# Altium footprint library PCB_Display_Doru.PcbLib: 47 footprints (part 3 of 3)
Each footprint in its own frame and in the unit in brackets; x right, y up, seen from the top. Pads: shape width x height; smd on the part's side, far side on the other; paste and mask are expansions set on the pad; w line width, h text height; cw(c..) or ccw(c..) is an arc to the next point about the centre after c.
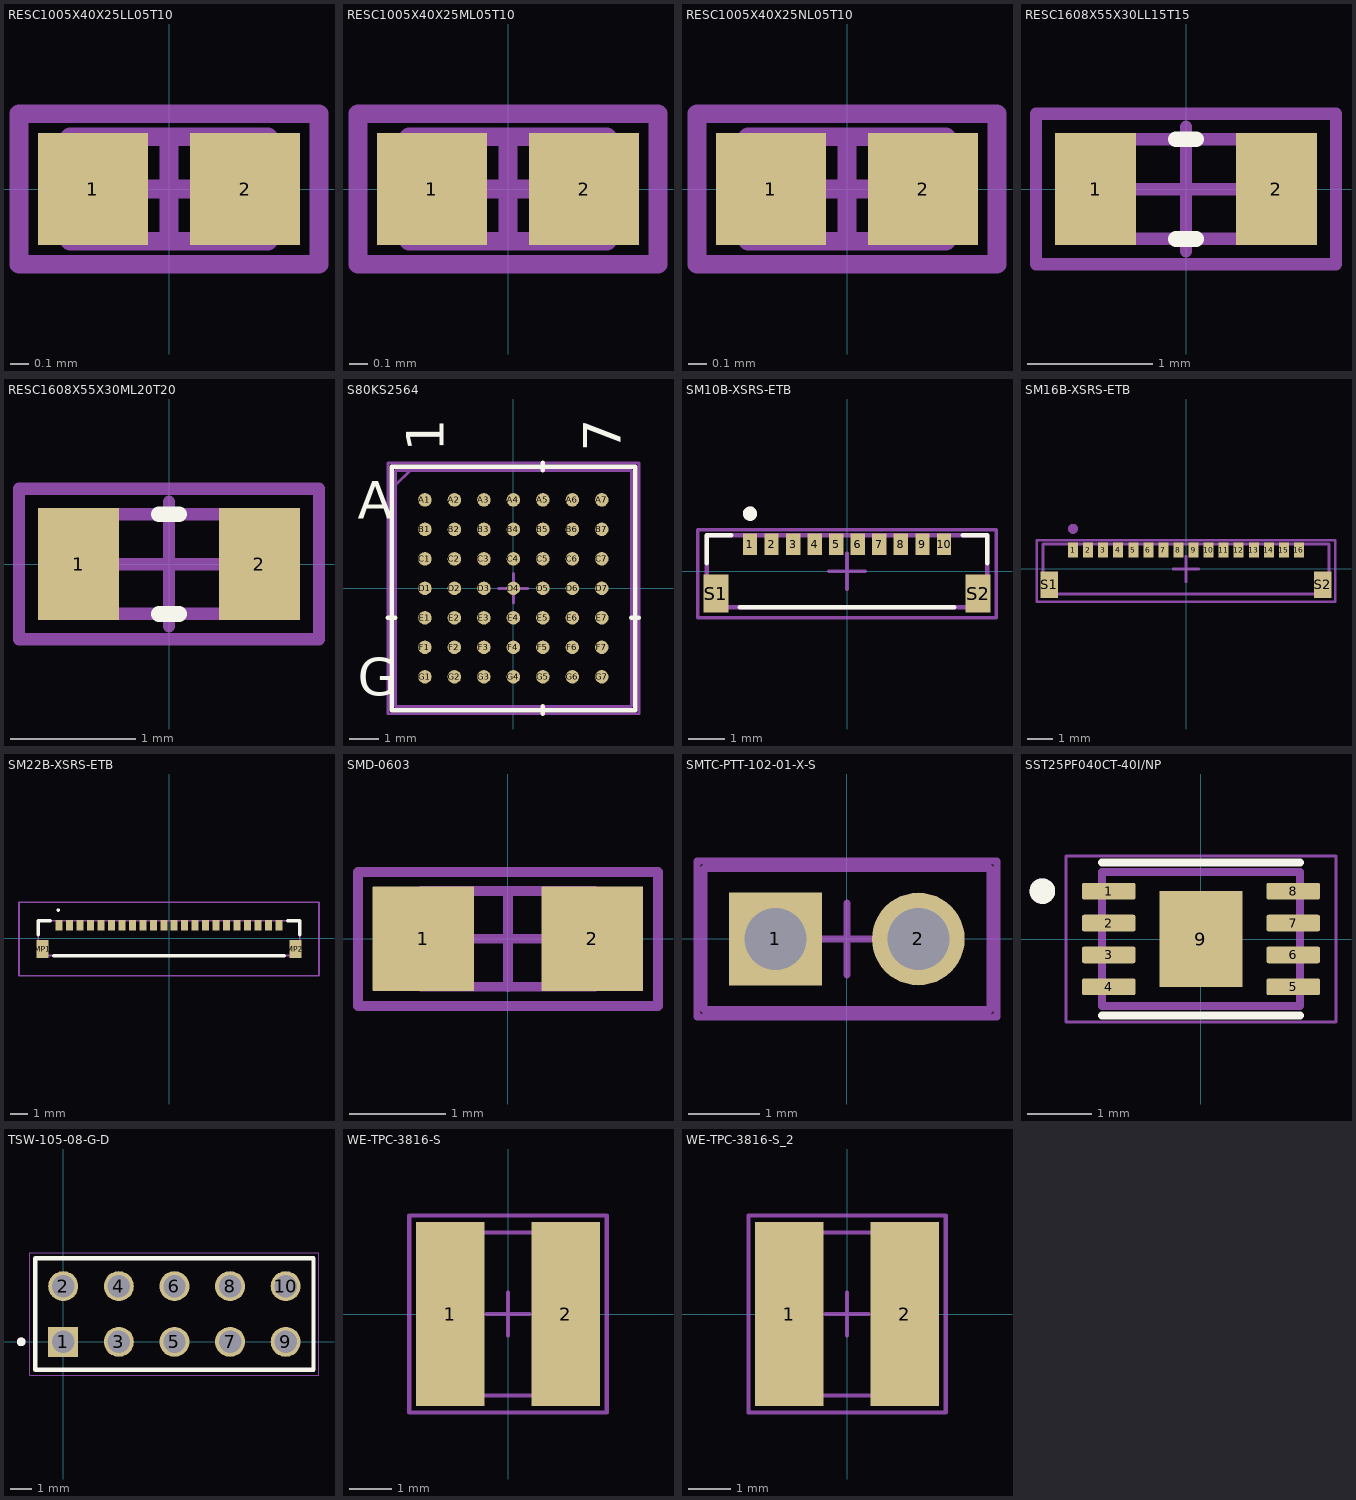
[diagram p2: the footprints below, top view; thin cyan lines are the x and y axes]

## RESC1005X40X25LL05T10 [mm] "Chip Resistor, 2-Leads, Body 1.00x0.50mm, IPC High Density"
height 0.4
pads (2):
  rrect1% 0.59x0.6 smd mask+0.05: 1(-0.407,0) 2(0.407,0)
Top Assembly (Mech13):
  lines w0.1: -0.53,-0.28 -0.53,0.28 0.53,0.28 0.53,-0.28 -0.53,-0.28
  text ".Designator" at -0.676,-0.068 h0.3
Top Component Outline (Mech15):
  lines w0.1: -0.28,0 0.28,0 ; 0,-0.28 0,0.28 ; -0.803,-0.402 0.803,-0.402 0.803,0.403 -0.803,0.403 -0.803,-0.402
3D body "step_temp.STEP": height 0.4, standoff 0, extent -0.5,-0.25 0.5,0.25

## RESC1005X40X25ML05T10 [mm] "Chip Resistor, 2-Leads, Body 1.00x0.50mm, IPC Low Density"
height 0.4
pads (2):
  rrect1% 0.59x0.6 smd mask+0.05: 1(-0.407,0) 2(0.407,0)
Top Assembly (Mech13):
  lines w0.1: -0.53,-0.28 0.53,-0.28 0.53,0.28 -0.53,0.28 -0.53,-0.28
  text ".Designator" at -0.676,-0.068 h0.3
Top Component Outline (Mech15):
  lines w0.1: -0.28,0 0.28,0 ; 0,-0.28 0,0.28 ; -0.803,-0.402 -0.803,0.403 0.803,0.403 0.803,-0.402 -0.803,-0.402
3D body "step_temp.STEP": height 0.4, standoff 0, extent -0.5,-0.25 0.5,0.25

## RESC1005X40X25NL05T10 [mm] "Chip Resistor, 2-Leads, Body 1.00x0.50mm, IPC Medium Density"
height 0.4
pads (2):
  rrect1% 0.59x0.6 smd mask+0.05: 1(-0.407,0) 2(0.407,0)
Top Assembly (Mech13):
  lines w0.1: -0.53,-0.28 0.53,-0.28 0.53,0.28 -0.53,0.28 -0.53,-0.28
  text ".Designator" at -0.676,-0.068 h0.3
Top Component Outline (Mech15):
  lines w0.1: -0.28,0 0.28,0 ; 0,-0.28 0,0.28 ; -0.803,-0.402 -0.803,0.403 0.803,0.403 0.803,-0.402 -0.803,-0.402
3D body "step_temp.STEP": height 0.4, standoff 0, extent -0.5,-0.25 0.5,0.25

## RESC1608X55X30LL15T15 [mm] "Chip Resistor, 2-Leads, Body 1.60x0.80mm, IPC High Density"
height 0.55
pads (2):
  rrect1% 0.65x0.9 smd: 1(-0.725,0) 2(0.725,0)
Top Overlay:
  lines w0.127: -0.08,-0.4 0.08,-0.4 ; -0.08,0.4 0.08,0.4
Top Assembly (Mech13):
  lines w0.1: -0.8,-0.4 -0.8,0.4 0.8,0.4 0.8,-0.4 -0.8,-0.4
  text ".Designator" at -0.676,-0.068 h0.3
Top Component Outline (Mech15):
  lines w0.1: -0.5,0 0.5,0 ; 0,-0.5 0,0.5 ; -1.203,-0.604 -1.203,0.606 1.203,0.606 1.203,-0.604 -1.203,-0.604
3D body "ERJ3EKF1000V.STEP": height 0.45, standoff 0, extent -0.8,-0.4 0.8,0.4

## RESC1608X55X30ML20T20 [mm] "Chip Resistor, 2-Leads, Body 1.60x0.80mm, IPC Low Density"
height 0.55
pads (2):
  rrect1% 0.65x0.9 smd: 1(-0.725,0) 2(0.725,0)
Top Overlay:
  lines w0.127: -0.08,-0.4 0.08,-0.4 ; -0.08,0.4 0.08,0.4
Top Assembly (Mech13):
  lines w0.1: -0.8,-0.4 -0.8,0.4 0.8,0.4 0.8,-0.4 -0.8,-0.4
  text ".Designator" at -0.676,-0.068 h0.3
Top Component Outline (Mech15):
  lines w0.1: -0.5,0 0.5,0 ; 0,-0.5 0,0.5 ; -1.203,-0.604 -1.203,0.606 1.203,0.606 1.203,-0.604 -1.203,-0.604
3D body "ERJ3EKF1000V.STEP": height 0.45, standoff 0, extent -0.8,-0.4 0.8,0.4

## S80KS2564 [mil]
pads (49):
  round 18 smd paste+0 mask+0: A1(-118.11,118.11) A2(-78.74,118.11) A3(-39.37,118.11) A4(0,118.11) A5(39.37,118.11) A6(78.74,118.11) A7(118.11,118.11) B1(-118.11,78.74) B2(-78.74,78.74) B3(-39.37,78.74) B4(0,78.74) B5(39.37,78.74) B6(78.74,78.74) B7(118.11,78.74) C1(-118.11,39.37) C2(-78.74,39.37) C3(-39.37,39.37) C4(0,39.37) C5(39.37,39.37) C6(78.74,39.37) C7(118.11,39.37) D1(-118.11,0) D2(-78.74,0) D3(-39.37,0) D4(0,0) D5(39.37,0) D6(78.74,0) D7(118.11,0) E1(-118.11,-39.37) E2(-78.74,-39.37) E3(-39.37,-39.37) E4(0,-39.37) E5(39.37,-39.37) E6(78.74,-39.37) E7(118.11,-39.37) F1(-118.11,-78.74) F2(-78.74,-78.74) F3(-39.37,-78.74) F4(0,-78.74) F5(39.37,-78.74) F6(78.74,-78.74) F7(118.11,-78.74) G1(-118.11,-118.11) G2(-78.74,-118.11) G3(-39.37,-118.11) G4(0,-118.11) G5(39.37,-118.11) G6(78.74,-118.11) G7(118.11,-118.11)
Top Overlay:
  lines w6: -167.5,-39.37 -157.5,-39.37 ; 39.37,-167.5 39.37,-157.5 ; 39.37,157.5 39.37,167.5 ; 157.5,-39.37 167.5,-39.37 ; -162.5,-162.5 -162.5,162.5 162.5,162.5 162.5,-162.5 -162.5,-162.5
  text "7" at 143.11,182.5 h50
  text "1" at -93.11,182.5 h50
  text "G" at -207.5,-143.11 h50
  text "A" at -207.5,93.11 h50
Top Assembly (Mech13):
  lines w3.94: -157.5,137.81 -137.81,157.5 ; -157.5,-157.5 -157.5,157.5 157.5,157.5 157.5,-157.5 -157.5,-157.5
  text ".Designator" at 0,2.22 h11.81
Top Component Outline (Mech15):
  lines w3.94: -19.68,0 19.69,0 ; 0,-19.69 0,19.68 ; -167.5,-167.5 167.5,-167.5 167.5,167.5 -167.5,167.5 -167.5,-167.5
3D body "PG-BGA-49.step": height 39.09, standoff 0.02, extent -157.48,-157.48 157.48,157.48

## SM10B-XSRS-ETB [mm]
pads (12):
  rrect1% 0.4x0.6 smd mask+0.05: 1(-2.7,0.75) 2(-2.1,0.75) 3(-1.5,0.75) 4(-0.9,0.75) 5(-0.3,0.75) 6(0.3,0.75) 7(0.9,0.75) 8(1.5,0.75) 9(2.1,0.75) 10(2.7,0.75)
  rrect1% 0.7x1.05 smd: S1(-3.65,-0.625) S2(3.65,-0.625)
Top Overlay:
  circle w0.2: c-2.7,1.6 r0.1
  lines w0.127: -3.9,0.22 -3.9,1 -3.22,1 ; -2.98,-1 2.98,-1 ; 3.22,1 3.9,1 3.9,0.22
Top Assembly (Mech13):
  circle w0.2: c-2.7,1.6 r0.1
  lines w0.127: -3.9,-1 -3.9,1 3.9,1 3.9,-1 -3.9,-1
  text ".Designator" at -0.612,-0.076 h0.3
Top Component Outline (Mech15):
  lines w0.1: -0.5,0 0.5,0 ; 0,-0.5 0,0.5 ; -4.151,-1.302 -4.151,1.152 4.151,1.152 4.151,-1.302 -4.151,-1.302
3D body "step_temp.STEP": height 1.45, standoff 0, extent -3.9,-1 3.9,1

## SM16B-XSRS-ETB [mm]
pads (18):
  rrect1% 0.4x0.6 smd mask+0.05: 1(-4.5,0.75) 2(-3.9,0.75) 3(-3.3,0.75) 4(-2.7,0.75) 5(-2.1,0.75) 6(-1.5,0.75) 7(-0.9,0.75) 8(-0.3,0.75) 9(0.3,0.75) 10(0.9,0.75) 11(1.5,0.75) 12(2.1,0.75) 13(2.7,0.75) 14(3.3,0.75) 15(3.9,0.75) 16(4.5,0.75)
  rrect1% 0.7x1.05 smd: S1(-5.45,-0.625) S2(5.45,-0.625)
Top Assembly (Mech13):
  circle w0.2: c-4.5,1.6 r0.1
  lines w0.127: -5.7,-1 -5.7,1 5.7,1 5.7,-1 -5.7,-1
  text ".Designator" at -0.612,-0.076 h0.3
Top Component Outline (Mech15):
  lines w0.1: -0.5,0 0.5,0 ; 0,-0.5 0,0.5 ; -5.951,-1.302 -5.951,1.152 5.952,1.152 5.952,-1.302 -5.951,-1.302
3D body "SM16B-XSRS-ETB-LF--SN---3DModel-STEP-56544.STEP": height 1.45, standoff 0, extent -5.7,-1 5.7,1

## SM22B-XSRS-ETB [mm]
pads (24):
  rect 0.4x0.6 smd: 1(-6.3,0.75) 2(-5.7,0.75) 3(-5.1,0.75) 4(-4.5,0.75) 5(-3.9,0.75) 6(-3.3,0.75) 7(-2.7,0.75) 8(-2.1,0.75) 9(-1.5,0.75) 10(-0.9,0.75) 11(-0.3,0.75) 12(0.3,0.75) 13(0.9,0.75) 14(1.5,0.75) 15(2.1,0.75) 16(2.7,0.75) 17(3.3,0.75) 18(3.9,0.75) 19(4.5,0.75) 20(5.1,0.75) 21(5.7,0.75) 22(6.3,0.75)
  rect 0.7x1.05 smd: MP1(-7.25,-0.625) MP2(7.25,-0.625)
Top Overlay:
  lines w0.1: -6.4,1.6 cw(c-6.35,1.6) -6.3,1.6 cw(c-6.35,1.6) -6.4,1.6
  lines w0.2: -7.5,0.2 -7.5,1 -6.8,1 ; -6.6,-1 6.6,-1 ; 6.8,1 7.5,1 7.5,0.2
Top Assembly (Mech13):
  lines w0.1: -7.5,-1 -7.5,1 7.5,1 7.5,-1 -7.5,-1
Top Component Outline (Mech15):
  lines w0.1: -8.6,-2.15 -8.6,2.05 8.6,2.05 8.6,-2.15 -8.6,-2.15
3D body "SM22B-XSRS-ETB.stp": height 1.55, standoff 0, extent -7.53,-1.08 7.53,1.01

## SMD-0603 [mm] "Chip Inductor, 2-Leads, Body 1.6x0.8mm"
height 0.95
pads (2):
  rrect1% 1.05x1.08 smd: 1(-0.875,0) 2(0.875,0)
Top Assembly (Mech13):
  lines w0.1: -0.902,-0.495 0.902,-0.495 0.902,0.495 -0.902,0.495 -0.902,-0.495
  text ".Designator" at -0.676,-0.068 h0.3
Top Component Outline (Mech15):
  lines w0.1: -0.5,0 0.5,0 ; 0,-0.5 0,0.5 ; -1.553,-0.694 -1.553,0.692 1.554,0.692 1.554,-0.694 -1.553,-0.694
3D body "IND_742792651_WRE.step": height 0.99, standoff 0, extent -0.902,-0.495 0.902,0.495

## SMTC-PTT-102-01-X-S [mil] "Press Fit Terminal Strip, 1x2 Pins, Vertical, 2mm Pitch, Male"
height 185.04
pads (2):
  rect 51x51 hole 34: 1(-39.38,0)
  round 51 hole 34: 2(39.36,0)
Top Assembly (Mech13):
  lines w3.94: -78.7,-39 -78.7,39 78.7,39 78.7,-39 -78.7,-39
  text ".Designator" at -26.63,-2.67 h11.81
Top Component Outline (Mech15):
  lines w3.94: -19.69,0 19.68,0 ; -0.01,-19.68 -0.01,19.68 ; -82.61,-42.93 -82.61,42.92 82.64,42.92 82.64,-42.93 -82.61,-42.93
3D body "PTT-102-01-X-S.step": height 185.04, standoff -131.02, extent -78.7,-38.99 78.7,39

## SST25PF040CT-40I/NP [mm]
pads (9):
  rrect25% 0.84x0.26 smd: 1(-1.445,0.75) 2(-1.445,0.25) 3(-1.445,-0.25) 4(-1.445,-0.75) 5(1.445,-0.75) 6(1.445,-0.25) 7(1.445,0.25) 8(1.445,0.75)
  rect 1.3x1.5 smd paste-0.24: 9(0,0)
Top Overlay:
  circle w0.2: c-2.485,0.75 r0.1
  lines w0.127: -1.55,-1.2 1.55,-1.2 ; -1.55,1.2 1.55,1.2
Top Assembly (Mech13):
  circle w0.2: c-2.485,0.75 r0.1
  lines w0.127: -1.55,-1.05 1.55,-1.05 1.55,1.05 -1.55,1.05 -1.55,-1.05
Top Component Outline (Mech15):
  lines w0.05: -2.115,-1.3 2.115,-1.3 2.115,1.3 -2.115,1.3 -2.115,-1.3
3D body "SST25PF040CT-40I_NP.STEP": height 0.6, standoff 0, extent -1.5,-1 1.5,1

## TSW-105-08-G-D [mm]
pads (10):
  rect 1.37x1.37 hole 1.02: 1(0,0)
  round 1.37 hole 1.02: 2(0,2.54) 3(2.54,0) 4(2.54,2.54) 5(5.08,0) 6(5.08,2.54) 7(7.62,0) 8(7.62,2.54) 9(10.16,0) 10(10.16,2.54)
Top Overlay:
  circle w0.2: c-1.92,0 r0.1
  lines w0.2: -1.27,-1.27 -1.27,3.81 11.43,3.81 11.43,-1.27 -1.27,-1.27
Top Assembly (Mech13):
  circle w0.2: c-1.92,0 r0.1
  lines w0.1: -1.27,-1.27 -1.27,3.81 11.43,3.81 11.43,-1.27 -1.27,-1.27
Top Component Outline (Mech15):
  lines w0.05: -1.52,-1.52 -1.52,4.06 11.68,4.06 11.68,-1.52 -1.52,-1.52
3D body "TSW-105-08-G-D.stp": height 8.38, standoff -5.08, extent -1.27,-1.27 11.43,3.81

## WE-TPC-3816-S [mm] "SMD Inductor, 2-Leads, Body 3.8 x 3.8 mm"
height 1.8
pads (2):
  rrect1% 1.6x4.3 smd: 1(-1.35,0) 2(1.35,0)
Top Assembly (Mech13):
  lines w0.1: -1.9,-1.9 1.9,-1.9 1.9,1.9 -1.9,1.9 -1.9,-1.9
  text ".Designator" at -0.676,-0.068 h0.3
Top Component Outline (Mech15):
  lines w0.1: -0.5,0 0.5,0 ; 0,-0.5 0,0.5 ; -2.303,-2.3 2.301,-2.3 2.301,2.3 -2.303,2.3 -2.303,-2.3
3D body "744031470.stp": height 1.64, standoff -0.01, extent -1.9,-1.9 1.9,1.9

## WE-TPC-3816-S_2 [mm]
pads (2):
  rrect1% 1.6x4.3 smd: 1(-1.35,0) 2(1.35,0)
Top Assembly (Mech13):
  lines w0.1: -1.9,-1.9 1.9,-1.9 1.9,1.9 -1.9,1.9 -1.9,-1.9
  text ".Designator" at -0.676,-0.068 h0.3
Top Component Outline (Mech15):
  lines w0.1: -0.5,0 0.5,0 ; 0,-0.5 0,0.5 ; -2.301,-2.3 2.302,-2.3 2.302,2.3 -2.301,2.3 -2.301,-2.3
3D body "744031470.stp": height 1.64, standoff -0.01, extent -1.9,-1.9 1.9,1.9